# Altium footprint library Toi Library.PcbLib: 740 footprints (part 10 of 47)
Each footprint in its own frame and in the unit in brackets; x right, y up, seen from the top. Pads: shape width x height; smd on the part's side, far side on the other; paste and mask are expansions set on the pad; w line width, h text height; cw(c..) or ccw(c..) is an arc to the next point about the centre after c.
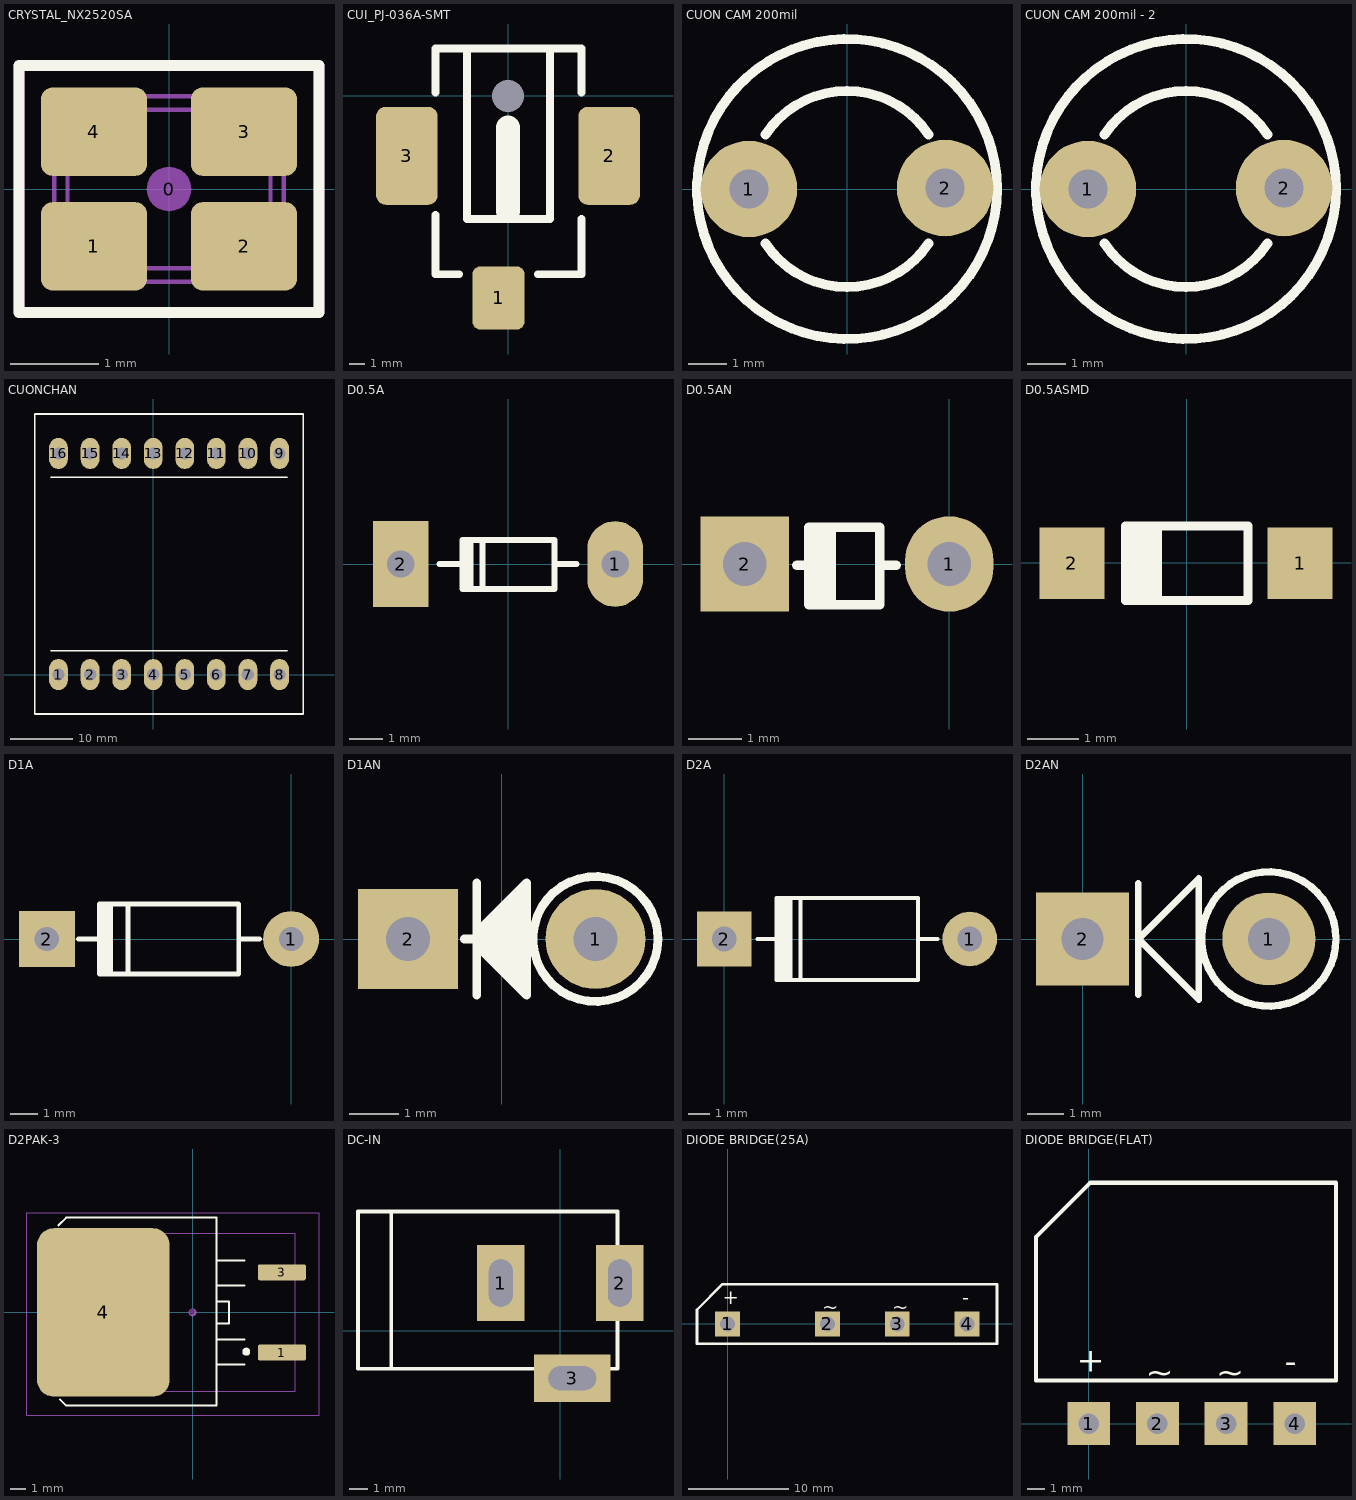
[diagram p9: the footprints below, top view; thin cyan lines are the x and y axes]

## CRYSTAL_NX2520SA [mm] "SMD Crystal 4-lead leadless package"
height 0.55
pads (5):
  round 0.508 on Mech15: 0(0,0)
  rrect25% 1.2x1 smd mask+0.075: 1(-0.85,-0.65) 2(0.85,-0.65) 3(0.85,0.65) 4(-0.85,0.65)
Top Overlay:
  lines w0.127: -1.7,-1.4 1.7,-1.4 1.7,1.4 -1.7,1.4 -1.7,-1.4
Mechanical 13:
  lines w0.05: -1.3,-0.87 cw(c-1.3,-1.05) -1.12,-1.05 1.12,-1.05 cw(c1.3,-1.05) 1.3,-0.87 1.3,0.87 cw(c1.3,1.05) 1.12,1.05 -1.12,1.05 cw(c-1.3,1.05) -1.3,0.87 -1.3,-0.87 ; -1.15,-0.75 ccw(c-1,-0.75) -1,-0.9 1,-0.9 ccw(c1,-0.75) 1.15,-0.75 1.15,0.75 ccw(c1,0.75) 1,0.9 -1,0.9 ccw(c-1,0.75) -1.15,0.75 -1.15,-0.75
Mechanical 15:
  lines w0.127: -1.7,-1.4 -1.7,1.4 1.7,1.4 1.7,-1.4 -1.7,-1.4
3D body "Crystal NDK NX2520SA series.STEP": height 0.55, standoff 0, extent -1.3,-1.05 1.3,1.05

## CUI_PJ-036A-SMT [mm]
pads (4):
  rrect30% 3.3x4 smd: 1(-0.6,-12.8)
  rrect30% 3.9x6.2 smd: 2(6.4,-3.8) 3(-6.4,-3.8)
  rrect30% 0x0 hole 2.032 unplated: 4(0,0)
Top Overlay:
  lines w0.5: -4.6,-7.55 -4.6,-11.3 -3.1,-11.3 ; -4.6,0.2 -4.6,3 4.65,3 4.65,0.2 ; -2.6,3 -2.6,-7.8 2.65,-7.8 2.65,2.9 ; 1.9,-11.3 4.65,-11.3 4.65,-7.8
  lines w1.5: 0,-7.3 0,-2
3D body "CUI-PJ-036A-SMT.step": height 11.09, standoff -1.51, extent -7.5,-14.1 7.7,3

## CUON CAM 200mil [mm]
pads (2):
  round 2.5 hole 1: 1(-2.54,0) 2(2.54,0.025)
Top Overlay:
  circle w0.254: c0,0 r3.886
  lines w0.254: -2.114,-1.409 ccw(c0,0) 2.114,-1.409 ; -2.114,1.409 cw(c0,0) 2.114,1.409
3D body "User Library-Inductor 10x12 (200 mils).STEP": height 12.02, standoff -3.98, extent -4.873,-4.984 5.127,5.016

## CUON CAM 200mil - 2 [mm]
pads (2):
  round 2.5 hole 1: 1(-2.54,0) 2(2.54,0.025)
Top Overlay:
  circle w0.254: c0,0 r3.886
  lines w0.254: -2.114,-1.409 ccw(c0,0) 2.114,-1.409 ; -2.114,1.409 cw(c0,0) 2.114,1.409
3D body "User Library-LC75.step": height 5.03, standoff 0.02, extent -3.81,-3.429 3.926,3.571

## CUONCHAN [mm]
pads (16):
  oval 3x5 hole 2: 1(-15.24,0) 2(-10.16,0) 3(-5.08,0) 4(0,0) 5(5.08,0) 6(10.16,0) 7(15.24,0) 8(20.32,0) 9(20.32,35.56) 10(15.24,35.56) 11(10.16,35.56) 12(5.08,35.56) 13(0,35.56) 14(-5.08,35.56) 15(-10.16,35.56) 16(-15.24,35.56)
Top Overlay:
  lines w0.254: -16.51,3.81 21.59,3.81 ; -16.51,31.75 21.59,31.75 ; -19.05,-6.35 -19.05,41.91 24.13,41.91 24.13,-6.35 -19.05,-6.35

## D0.5A [mil] "Diode muoi, W 80mil, L 300mil"
height 80
pads (2):
  oval 65x100 hole 32: 1(125,0)
  rect 65x100 hole 32: 2(-125,0)
Top Overlay:
  rectangle: -55,-30 -40,25
  lines w7: -80,0 -53,0 ; -30,-29 -30,28 ; 54,0 80,0 ; -53,-29 54,-29 54,28 -53,28 -53,-29
3D body "SW3dPS-1N4148.STEP": height 61.22, standoff -50, extent -108.5,-32.96 108.5,32

## D0.5AN [mil] "Diode muoi, W 80mil, L 300mil"
height 80
pads (2):
  oval 65x70 hole 32: 1(0,0)
  rect 65x70 hole 32: 2(-150,0)
Top Overlay:
  rectangle: -105,-31 -83,24
  lines w7: -112,-1 -103,-1 ; -49,-1 -39,-1 ; -103,-30 -51,-30 -51,27 -103,27 -103,-30

## D0.5ASMD [mil] "Diode muoi, W 80mil, L 300mil"
height 80
pads (2):
  rect 50x55 smd: 1(87,-0.5) 2(-88,-0.5)
Top Overlay:
  rectangle: -49,-30 -19,25
  lines w7: -47,-29 -47,28 47,28 47,-29 -47,-29

## D1A [mil] "Diode 1A, W 100mil, L 350mil"
height 100
pads (2):
  round 80 hole 35: 1(0,0)
  rect 80x80 hole 35: 2(-350,0)
Top Overlay:
  rectangle: -275,-50 -255,50
  lines w7: -305,0 -275,0 ; -275,-16 -275,0 ; -275,21 -275,0 ; -234,-50 -234,47 ; -75,0 -45,0 ; -275,0 -275,-50 -75,-50 -75,50 -275,50 -275,0
3D body "SW3dPS-do_35.STEP": height 84.5, standoff -100, extent -386.49,-33 34.49,36

## D1AN [mil] "Diode 1A, W 100mil, L 150mil"
height 100
pads (2):
  round 80 hole 35: 1(75,0)
  rect 80x80 hole 35: 2(-75,0)
Top Overlay:
  circle w7: c75,0 r50
  region: 20,40 20,-40 15,-40 -20,-5 -20,5
  lines w7: -30,0 -20,0 ; -20,-45 -20,45 ; -20,-5 20,-45 20,45 -20,5 -20,-5
3D body "SW3dPS-1N4007_Stand.STEP": height 252.32, standoff -78.14, extent -64,-50 104,55

## D2A [mil] "Diode 2A, W 150mil, L 450mil"
height 100
pads (2):
  round 100 hole 45: 1(450,0)
  rect 100x100 hole 45: 2(0,0)
Top Overlay:
  rectangle: 95,-75 125,75
  lines w7: 61,0 96,0 ; 96,-31 96,0 ; 96,32 96,0 ; 140,-75 140,75 ; 355,0 391,0 ; 96,-75 355,-75 355,75 96,75 96,-75
3D body "SW3DPS-DIODE0_4-DEFAULT.STEP": height 100.5, standoff -100, extent 5,-47 435,54

## D2AN [mil] "Diode 2A, W 150mil, L 450mil"
height 100
pads (2):
  round 100 hole 45: 1(200,0)
  rect 100x100 hole 45: 2(0,0)
Top Overlay:
  circle w8: c200,0 r72.11
  lines w7: 60,-60 60,60 ; 125,50 125,65 60,0 125,-65 125,55
3D body "SW3dPS-Zener 1W_Stand.STEP": height 252.32, standoff -78.14, extent 46.01,-49.99 214.01,55

## D2PAK-3 [mil] "D-PAK/TO-263-3; 3 Leads (1 Cropped); Body 14.7 (inc. leads) x 10.2 mm (LxW max)"
height 180
pads (4):
  round 20 on Mech15: 0(0,0)
  rrect25% 120x40 smd: 1(222.5,-100) 3(222.5,100)
  rrect25% 330x420 smd: 4(-222.5,0)
Top Overlay:
  circle w9.84: c133.8,-97.83 r4.92
  lines w5: -334.65,216.54 -314.96,236.22 59.06,236.22 59.06,-232.28 -314.96,-232.28 -330.71,-216.54 ; 129.92,-129.92 59.06,-129.92 59.06,-66.93 129.92,-66.93 ; 129.92,66.93 59.06,66.93 59.06,129.92 129.92,129.92 ; 59.06,-27.56 90.55,-27.56 90.55,27.56 59.06,27.56 59.06,-27.56
Mechanical 13:
  lines w3: -361.41,-196.85 -361.41,196.85 255.51,196.85 255.51,-196.85 -361.41,-196.85
Mechanical 15:
  lines w3: -413.39,-255.91 314.96,-255.91 314.96,248.03 -413.39,248.03 -413.39,-255.91
3D body "SW3dPS-TO263-3S.STEP": height 189.36, standoff 0.39, extent -361.41,-196.85 255.51,196.85

## DC-IN [mil]
pads (3):
  rect 100x160 hole 50 slot 100 at 90 deg: 1(-125,100) 2(125,100)
  rect 160x100 hole 50 slot 100 at 0 deg: 3(25,-100)
Top Overlay:
  lines w8: -355,-80 -355,250 ; -425,-80 -425,250 120,250 120,-80 -425,-80
3D body "SW3dPS-dc range - dc connector[4840.2201].STEP": height 433.67, standoff -137.2, extent -410.35,-105.12 134,269.12

## DIODE BRIDGE(25A) [mm]
pads (4):
  rect 2.5x2.5 hole 1.5: 1(0,0)
  rect 2.5x2.5 / inner round 1.575 / far side rect 2.5x2.5 hole 1.5: 2(10,0) 3(17,0) 4(24,0)
Top Overlay:
  lines w0.254: -3.073,-2 -3.073,1.427 -0.5,4 27,4 27,-2 7.53,-2 -3.073,-2
  text "-" at 23.5,2 h1.43
  text "+" at -0.5,2 h1.43
  text "~" at 16.5,1 h1.43
  text "~" at 9.5,1 h1.43

## DIODE BRIDGE(FLAT) [mm]
pads (4):
  rect 2.5x2.5 / inner round 1.575 / far side rect 2.5x2.5 hole 1.2: 1(0,0) 2(4,0) 3(8,0) 4(12,0)
Top Overlay:
  lines w0.254: -3.073,2.515 2.045,2.515 14.402,2.515 14.402,14.021 0.076,14.021 -3.073,10.871 -3.073,2.515
  text "~" at 3.327,2.286 h1.43
  text "~" at 7.417,2.299 h1.43
  text "+" at -0.686,3.01 h1.43
  text "-" at 11.405,2.946 h1.43